# Altium footprint library 全库.PcbLib: 967 footprints (part 25 of 61)
Each footprint in its own frame and in the unit in brackets; x right, y up, seen from the top. Pads: shape width x height; smd on the part's side, far side on the other; paste and mask are expansions set on the pad; w line width, h text height; cw(c..) or ccw(c..) is an arc to the next point about the centre after c.
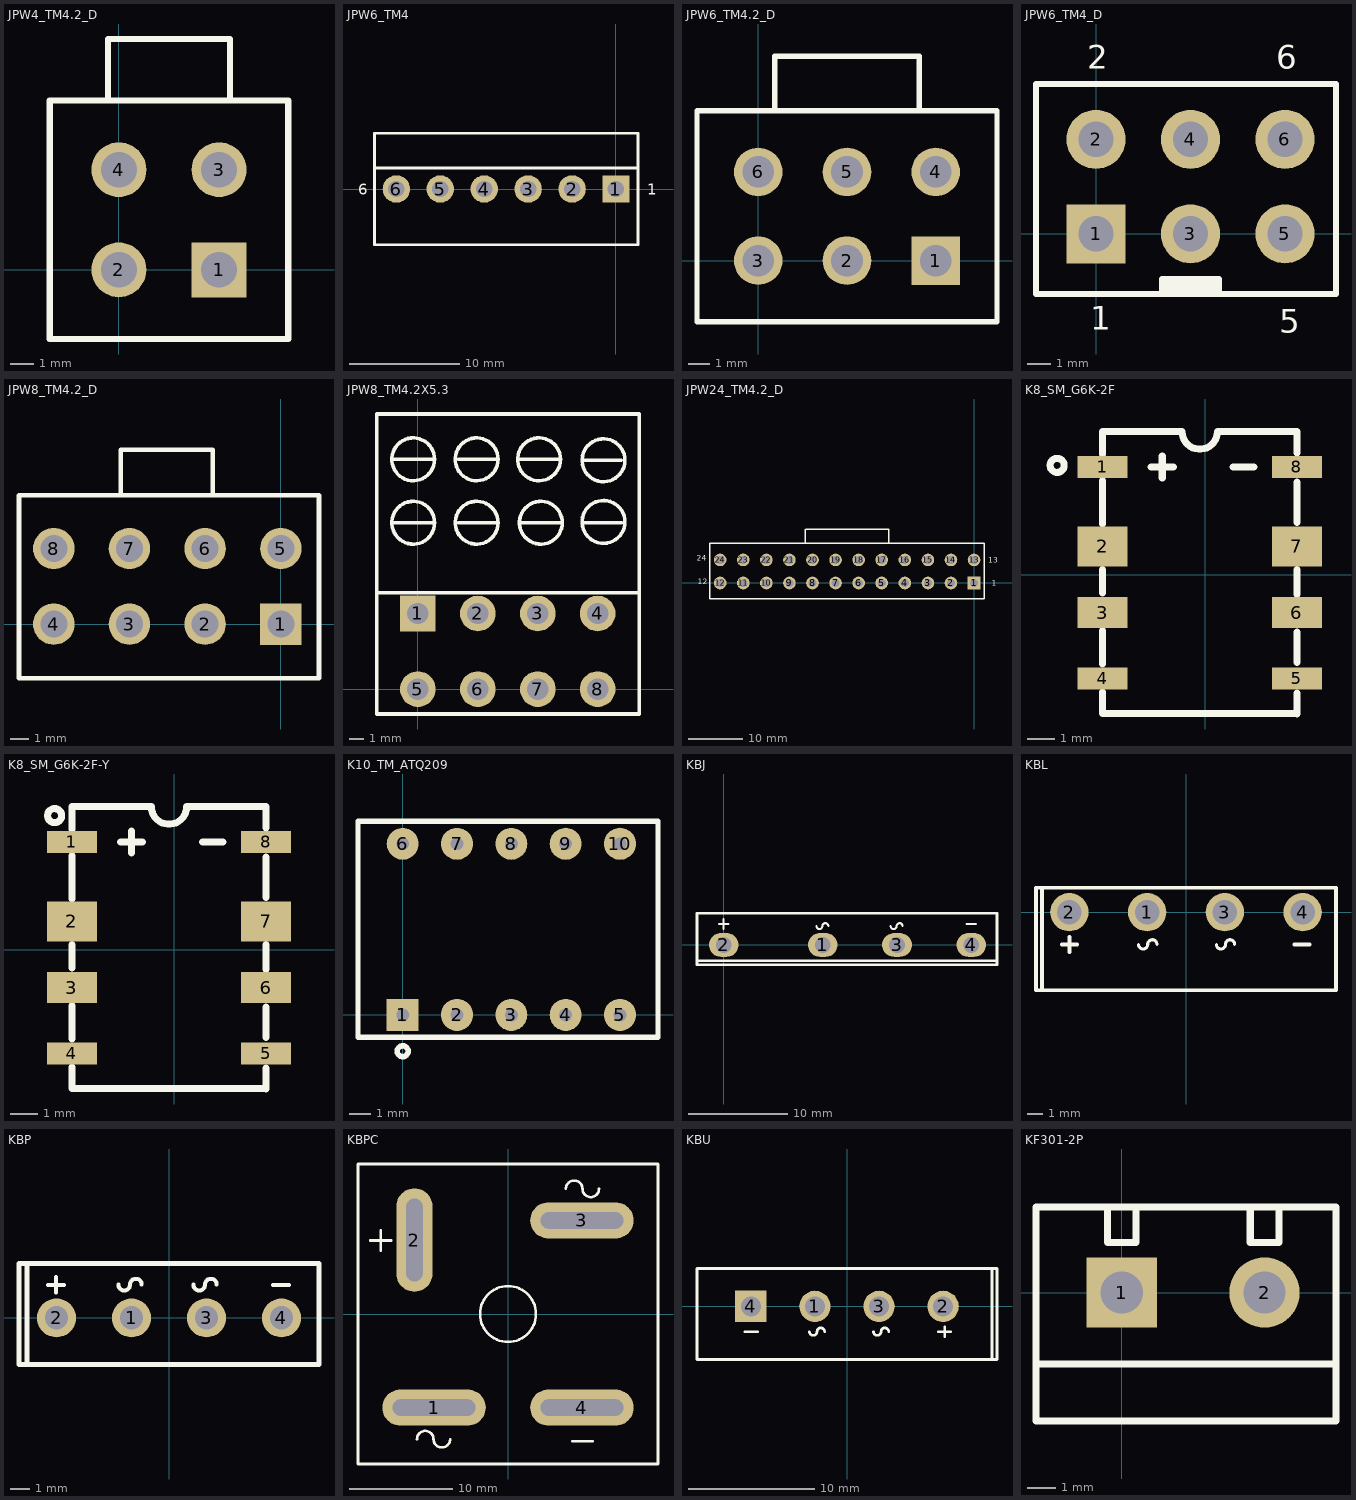
[diagram p24: the footprints below, top view; thin cyan lines are the x and y axes]

## JPW4_TM4.2_D [mm]
pads (4):
  rect 2.3x2.3 hole 1.5: 1(4.2,0)
  round 2.3 hole 1.5: 2(0,0) 3(4.2,4.2) 4(0,4.2)
Top Overlay:
  lines w0.254: -0.45,7.18 -0.45,9.68 4.66,9.68 4.66,7.2 ; -2.9,-2.9 -2.9,7.1 7.1,7.1 7.1,-2.9 -2.9,-2.9

## JPW6_TM4 [mm]
pads (6):
  rect 2.5x2.5 hole 1.5: 1(0,0)
  round 2.5 hole 1.5: 2(-4,0) 3(-8,0) 4(-12,0) 5(-16,0) 6(-20,0)
Top Overlay:
  lines w0.254: -22,1.905 2,1.905 ; -22,-5.08 2,-5.08 2,5.08 -22,5.08 -22,-5.08
  text "1" at 2.827,-0.508 h1
  text "6" at -23.495,-0.508 h1

## JPW6_TM4.2_D [mm]
pads (6):
  rect 2.3x2.3 hole 1.5: 1(8.4,0)
  round 2.3 hole 1.5: 2(4.2,0) 3(0,0) 4(8.4,4.2) 5(4.2,4.2) 6(0,4.2)
Top Overlay:
  lines w0.254: 0.78,7.18 0.78,9.68 7.62,9.68 7.62,7.2 ; -2.9,-2.9 11.3,-2.9 11.3,7.1 -2.9,7.1 -2.9,-2.9

## JPW6_TM4_D [mm]
pads (6):
  rect 2.5x2.5 hole 1.5: 1(0,0)
  round 2.5 hole 1.5: 2(0,4) 3(4,0) 4(4,4) 5(8,0) 6(8,4)
Top Overlay:
  lines w0.254: 2.794,-2.54 2.794,-1.905 5.207,-1.905 5.207,-2.54 5.207,-2.381 ; 2.921,-2.286 5.207,-2.286 ; 2.921,-2.159 5.207,-2.159 ; -2.54,-2.54 -2.54,6.35 10.16,6.35 10.16,-2.54 -2.54,-2.54
  text "6" at 7.62,6.985 h1
  text "5" at 7.747,-4.191 h1
  text "2" at -0.381,6.985 h1
  text "1" at -0.254,-4.064 h1

## JPW8_TM4.2_D [mm]
pads (8):
  rect 2.3x2.3 hole 1.5: 1(0,0)
  round 2.3 hole 1.5: 2(-4.2,0) 3(-8.4,0) 4(-12.6,0) 5(0,4.2) 6(-4.2,4.2) 7(-8.4,4.2) 8(-12.6,4.2)
Top Overlay:
  lines w0.254: -8.88,7.17 -8.88,9.67 -3.77,9.67 -3.77,7.19 ; -14.53,-2.99 2.12,-2.99 2.12,7.15 -14.53,7.15 -14.53,-2.99

## JPW8_TM4.2X5.3 [mm]
pads (8):
  rect 2.5x2.5 hole 1.5: 1(0,5.3)
  round 2.5 hole 1.5: 2(4.2,5.3) 3(8.4,5.3) 4(12.6,5.3) 5(0,0) 6(4.2,0) 7(8.4,0) 8(12.6,0)
Top Overlay:
  circle w0.254: c8.618,11.659 r1.5
  circle w0.254: c4.115,11.659 r1.5
  circle w0.254: c-0.33,11.659 r1.5
  circle w0.254: c13.005,11.718 r1.5
  circle w0.254: c13.005,16.036 r1.5
  circle w0.254: c-0.33,16.104 r1.5
  circle w0.254: c4.115,16.104 r1.5
  circle w0.254: c8.491,16.104 r1.5
  lines w0.254: -2.894,6.765 15.394,6.765 15.521,6.638 ; -1.661,11.659 1.006,11.659 ; -1.661,16.104 1.006,16.104 ; 2.848,11.659 5.515,11.659 ; 2.848,16.104 5.515,16.104 ; 7.166,16.104 9.833,16.104 ; 7.293,11.659 9.96,11.659 ; 11.584,16.036 14.251,16.036 ; 11.611,11.659 14.278,11.659 ; -2.894,-1.744 15.521,-1.744 15.521,19.279 -2.894,19.279 -2.894,-1.744

## JPW24_TM4.2_D [mm]
pads (24):
  rect 2.3x2.3 hole 1.5: 1(0,0)
  round 2.3 hole 1.5: 2(-4.2,0) 3(-8.4,0) 4(-12.6,0) 5(-16.8,0) 6(-21,0) 7(-25.2,0) 8(-29.4,0) 9(-33.6,0) 10(-37.8,0) 11(-42,0) 12(-46.2,0) 13(0,4.2) 14(-4.2,4.2) 15(-8.4,4.2) 16(-12.6,4.2) 17(-16.8,4.2) 18(-21,4.2) 19(-25.2,4.2) 20(-29.4,4.2) 21(-33.6,4.2) 22(-37.8,4.2) 23(-42,4.2) 24(-46.2,4.2)
Top Overlay:
  lines w0.254: -30.69,7.22 -30.69,9.77 ; -30.65,9.76 -15.48,9.76 ; -15.48,7.22 -15.48,9.74 ; -48.1,-2.86 -48.1,7.2 1.9,7.2 1.9,-2.86 -48.1,-2.86
  text "1" at 3.175,-0.508 h1
  text "13" at 2.54,3.683 h1
  text "24" at -50.419,4.064 h1
  text "12" at -50.292,-0.254 h1

## K8_SM_G6K-2F [mm]
pads (8):
  rect 1.8x0.8 smd: 1(-3.698,3.881) 4(-3.698,-3.739) 5(3.302,-3.739) 8(3.302,3.881)
  rect 1.8x1.45 smd: 2(-3.698,1.016) 7(3.302,1.016)
  rect 1.8x1.13 smd: 3(-3.698,-1.364) 6(3.302,-1.364)
Top Overlay:
  circle w0.254: c-5.334,3.937 r0.254
  lines w0.254: -3.698,-5.009 3.302,-5.009 ; -3.698,-4.969 -3.698,-4.219 ; -3.698,-3.219 -3.698,-2.019 ; -3.698,-0.669 -3.698,0.181 ; -3.698,1.831 -3.698,3.381 ; -3.698,4.331 -3.698,5.131 ; -3.698,5.151 -0.833,5.151 ccw(c-0.198,5.151) 0.437,5.151 3.302,5.151 ; -1.948,3.881 -1.148,3.881 ; -1.548,3.481 -1.548,4.281 ; 1.002,3.881 1.752,3.881 ; 3.302,-5.019 3.302,-4.269 ; 3.302,-3.169 3.302,-2.069 ; 3.302,-0.719 3.302,0.181 ; 3.302,1.881 3.302,3.331 ; 3.302,4.381 3.302,5.131

## K8_SM_G6K-2F-Y [mm]
pads (8):
  rect 1.8x0.8 smd: 1(-3.698,3.881) 4(-3.698,-3.739) 5(3.302,-3.739) 8(3.302,3.881)
  rect 1.8x1.45 smd: 2(-3.698,1.016) 7(3.302,1.016)
  rect 1.8x1.13 smd: 3(-3.698,-1.364) 6(3.302,-1.364)
Top Overlay:
  circle w0.254: c-4.318,4.826 r0.254
  lines w0.254: -3.698,-5.009 3.302,-5.009 ; -3.698,-4.969 -3.698,-4.219 ; -3.698,-3.219 -3.698,-2.019 ; -3.698,-0.669 -3.698,0.181 ; -3.698,1.831 -3.698,3.381 ; -3.698,4.331 -3.698,5.131 ; -3.698,5.151 -0.833,5.151 ccw(c-0.198,5.151) 0.437,5.151 3.302,5.151 ; -1.948,3.881 -1.148,3.881 ; -1.548,3.481 -1.548,4.281 ; 1.002,3.881 1.752,3.881 ; 3.302,-5.019 3.302,-4.269 ; 3.302,-3.169 3.302,-2.069 ; 3.302,-0.719 3.302,0.181 ; 3.302,1.881 3.302,3.331 ; 3.302,4.381 3.302,5.131

## K10_TM_ATQ209 [mm]
pads (10):
  rect 1.5x1.5 hole 0.6: 1(0,0)
  round 1.5 hole 0.6: 2(2.54,0) 3(5.08,0) 4(7.62,0) 5(10.16,0) 6(0,8) 7(2.54,8) 8(5.08,8) 9(7.62,8.001) 10(10.16,8.001)
Top Overlay:
  circle w0.254: c0,-1.7 r0.254
  lines w0.254: -2.09,-1.05 11.938,-1.05 11.938,9.05 -2.09,9.05 -2.09,3.365 -2.09,-1.05

## KBJ [mm]
pads (4):
  oval 3x2.4 hole 1.6: 1(10,0) 2(0,0) 3(17.5,0) 4(25,0)
Top Overlay:
  lines w0.203: -0.5,2.1 0.5,2.1 ; 0,1.6 0,2.6 ; 9.36,1.9 ccw(c9.66,1.9) 9.96,1.9 cw(c10.26,1.9) 10.56,1.9 ; 16.86,1.9 ccw(c17.16,1.9) 17.46,1.9 cw(c17.76,1.9) 18.06,1.9 ; 24.5,2.1 25.5,2.1
  lines w0.254: -2.7,-1.6 27.6,-1.6 ; -2.7,-2 27.6,-2 27.6,3.2 -2.7,3.2 -2.7,-2

## KBL [mm]
pads (4):
  round 2.5 hole 1.6: 1(-2.54,0) 2(-7.62,0) 3(2.54,0) 4(7.62,0)
Top Overlay:
  lines w0.203: -3.1,-2.1 ccw(c-2.8,-2.1) -2.5,-2.1 cw(c-2.2,-2.1) -1.9,-2.1 ; 1.98,-2.1 ccw(c2.28,-2.1) 2.58,-2.1 cw(c2.88,-2.1) 3.18,-2.1
  lines w0.254: -9.4,-5.1 -9.4,1.5 ; -8.12,-2.1 -7.12,-2.1 ; -7.62,-2.6 -7.62,-1.6 ; 7.08,-2.1 8.08,-2.1 ; -9.8,-5.1 9.8,-5.1 9.8,1.6 -9.8,1.6 -9.8,-5.1

## KBP [mm]
pads (4):
  round 2 hole 1.2: 1(-1.925,0) 2(-5.775,0) 3(1.925,0) 4(5.775,0)
Top Overlay:
  lines w0.203: -6.2,1.7 -5.4,1.7 ; -5.8,1.3 -5.8,2.1 ; -2.6,1.708 ccw(c-2.3,1.708) -2,1.708 cw(c-1.7,1.708) -1.4,1.708 ; 1.25,1.708 ccw(c1.55,1.708) 1.85,1.708 cw(c2.15,1.708) 2.45,1.708 ; 5.35,1.7 6.15,1.7
  lines w0.254: -7.3,-2.4 -7.3,2.8 ; -7.7,-2.4 7.7,-2.4 7.7,2.8 -7.7,2.8 -7.7,-2.4

## KBPC [mm]
pads (4):
  oval 10x3.5 hole 1.6 slot 8 at 0 deg: 1(-7.15,-9.05) 3(7.15,9.05) 4(7.15,-9.05)
  oval 3.5x10 hole 1.6 slot 8 at 90 deg: 2(-9.05,7.15)
Top Overlay:
  circle w0.254: c0,0 r2.7
  lines w0.254: -13.3,7.1 -11.3,7.1 ; -12.3,6.1 -12.3,8.1 ; -8.8,-12.1 cw(c-8,-12.1) -7.2,-12.1 ccw(c-6.4,-12.1) -5.6,-12.1 ; 5.6,12.1 cw(c6.4,12.1) 7.2,12.1 ccw(c8,12.1) 8.8,12.1 ; 6.2,-12.3 8.2,-12.3 ; -14.5,-14.5 14.5,-14.5 14.5,14.5 -14.5,14.5 -14.5,-14.5

## KBU [mm]
pads (4):
  round 2.5 hole 1.6: 1(-2.54,0) 2(7.62,0) 3(2.54,0)
  rect 2.5x2.5 hole 1.6: 4(-7.62,0)
Top Overlay:
  lines w0.203: -8.1,-2 -7.1,-2 ; -2.98,-2 ccw(c-2.68,-2) -2.38,-2 cw(c-2.08,-2) -1.78,-2 ; 2.1,-2 ccw(c2.4,-2) 2.7,-2 cw(c3,-2) 3.3,-2 ; 7.24,-2 8.24,-2 ; 7.74,-2.4 7.74,-1.6
  lines w0.254: 11.5,-4.2 11.5,3 ; -11.9,-4.2 11.9,-4.2 11.9,3 -11.9,3 -11.9,-4.2

## KF301-2P [mm] "可拼接端子/6A"
pads (2):
  rect 2.5x2.5 hole 1.5: 1(0,0)
  round 2.5 hole 1.5: 2(5.08,0)
Top Overlay:
  lines w0.254: -3.048,-2.54 7.62,-2.54 ; -0.508,3.048 -0.508,1.778 0.508,1.778 0.508,3.048 ; 4.572,3.048 4.572,1.778 5.588,1.778 5.588,3.048 ; -3.048,-4.572 -3.048,3.048 7.62,3.048 7.62,-4.572 -3.048,-4.572
3D body "KF301.STEP": height 10.05, standoff -3.75, extent -2.95,-4.6 2.55,3
3D body "KF301.STEP": height 10.05, standoff -3.75, extent 2.025,-4.65 7.525,2.95